# Altium footprint library Reflow3D1411sep.PcbLib: 657 footprints (part 12 of 42)
Each footprint in its own frame and in the unit in brackets; x right, y up, seen from the top. Pads: shape width x height; smd on the part's side, far side on the other; paste and mask are expansions set on the pad; w line width, h text height; cw(c..) or ccw(c..) is an arc to the next point about the centre after c.
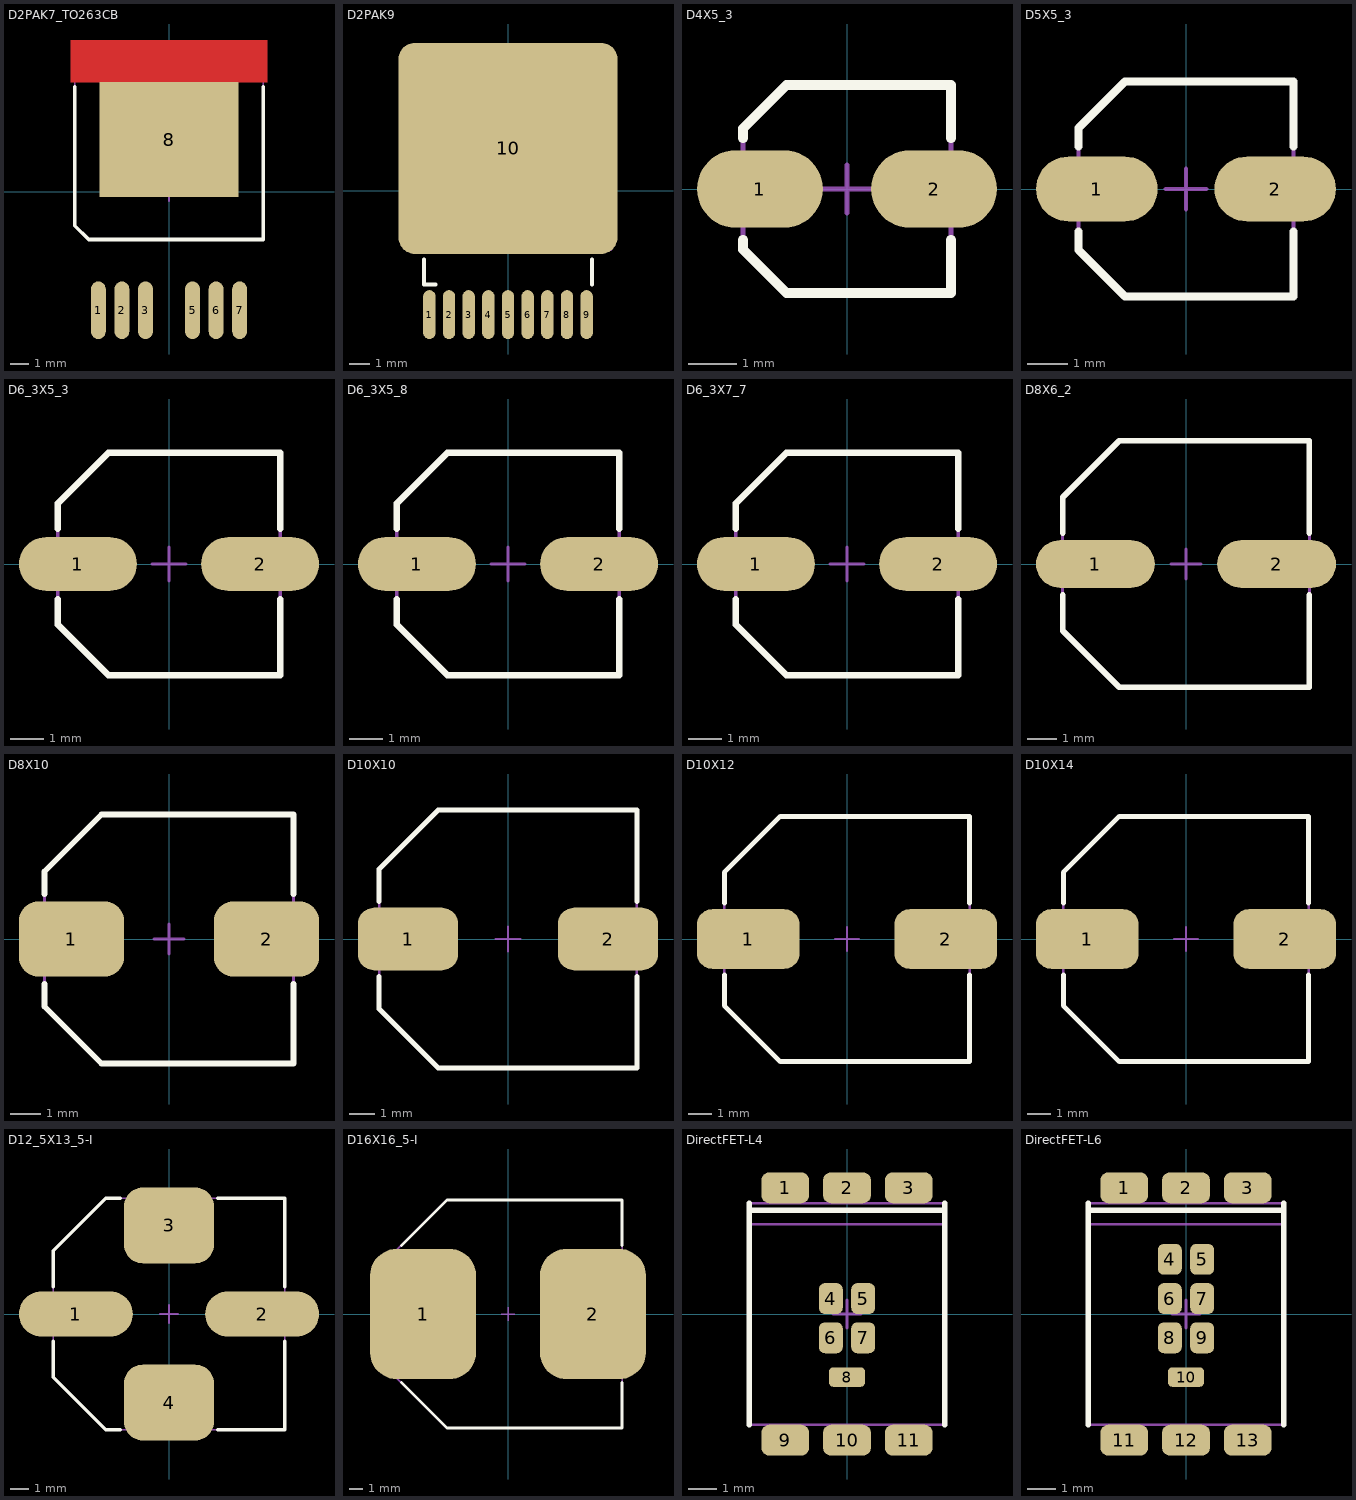
[diagram p11: the footprints below, top view; thin cyan lines are the x and y axes]

## D2PAK7_TO263CB [mm] "www.nxp.com, SOT427-REFLOW.pdf; www.irf.com, po_d2pak-7l.pdf; www.jedec.org, TO-263E.pdf"
height 4.45
pads (7):
  oval 0.8x3.1 smd paste-25.4 mask+0.075: 1(-3.81,-6.4) 2(-2.54,-6.4) 3(-1.27,-6.4) 5(1.27,-6.4) 6(2.54,-6.4) 7(3.81,-6.4)
  rect 7.5x6.2 smd paste-25.4 mask-25.4: 8(0,2.8)
Top Layer:
  region: -5.3,5.9 5.3,5.9 5.3,8.15 -5.3,8.15
Top Overlay:
  lines w0.2: -5.08,5.65 -5.08,-1.84 -4.33,-2.59 5.08,-2.59 5.08,5.65
Top Paste:
  region: -4.16,-6.5 -4.16,-7.9 -3.46,-7.9 -3.46,-6.5
  region: -4.16,-4.9 -4.16,-6.3 -3.46,-6.3 -3.46,-4.9
  region: -2,1.25 -3.7,1.25 -3.7,-0.25 -2,-0.25
  region: -3.75,5.95 -3.75,8.1 -5.25,8.1 -5.25,5.95
  region: -0.1,1.25 -1.8,1.25 -1.8,-0.25 -0.1,-0.25
  region: 3.7,1.25 2,1.25 2,-0.25 3.7,-0.25
  region: 1.8,1.25 0.1,1.25 0.1,-0.25 1.8,-0.25
  region: 1.8,4.35 0.1,4.35 0.1,2.85 1.8,2.85
  region: 3.7,4.35 2,4.35 2,2.85 3.7,2.85
  region: -0.1,4.35 -1.8,4.35 -1.8,2.85 -0.1,2.85
  region: -2,4.35 -3.7,4.35 -3.7,2.85 -2,2.85
  region: -1.95,5.95 -1.95,8.1 -3.45,8.1 -3.45,5.95
  region: -0.15,5.95 -0.15,8.1 -1.65,8.1 -1.65,5.95
  region: 5.25,5.95 5.25,8.1 3.75,8.1 3.75,5.95
  region: 3.45,5.95 3.45,8.1 1.95,8.1 1.95,5.95
  region: 1.65,5.95 1.65,8.1 0.15,8.1 0.15,5.95
  region: -2.89,-4.9 -2.89,-6.3 -2.19,-6.3 -2.19,-4.9
  region: -2.89,-6.5 -2.89,-7.9 -2.19,-7.9 -2.19,-6.5
  region: -1.62,-4.9 -1.62,-6.3 -0.92,-6.3 -0.92,-4.9
  region: -1.62,-6.5 -1.62,-7.9 -0.92,-7.9 -0.92,-6.5
  region: 0.92,-4.9 0.92,-6.3 1.62,-6.3 1.62,-4.9
  region: 0.92,-6.5 0.92,-7.9 1.62,-7.9 1.62,-6.5
  region: 2.19,-4.9 2.19,-6.3 2.89,-6.3 2.89,-4.9
  region: 2.19,-6.5 2.19,-7.9 2.89,-7.9 2.89,-6.5
  region: 3.46,-4.9 3.46,-6.3 4.16,-6.3 4.16,-4.9
  region: 3.46,-6.5 3.46,-7.9 4.16,-7.9 4.16,-6.5
Top Solder:
  region: 3.825,-0.375 3.825,5.825 5.375,5.825 5.375,8.225 -5.375,8.225 -5.375,5.825 -3.825,5.825 -3.825,-0.375
Mechanical 13:
  lines w0.1: -5.08,-1.84 -5.08,6.41 5.08,6.41 5.08,-2.59 -4.33,-2.59 -5.08,-1.84
Mechanical 15:
  lines w0.1: -0.5,0 0.5,0 ; 0,-0.5 0,0.5
3D body: height 4.83, standoff 0, extent -5.335,-2.915 5.335,6.735

## D2PAK9 [mm] "www.national.com, ts9a.pdf, AN-1797.pdf"
height 4.57
pads (10):
  oval 0.61x2.41 smd mask+0.075: 1(-3.88,-6.1) 2(-2.91,-6.1) 3(-1.94,-6.1) 4(-0.97,-6.1) 5(0,-6.1) 6(0.97,-6.1) 7(1.94,-6.1) 8(2.91,-6.1) 9(3.88,-6.1)
  rrect15% 10.8x10.41 smd paste-25.4 mask+0.075: 10(0,2.1)
Top Overlay:
  lines w0.2: -4.135,-3.375 -4.135,-4.625 -3.575,-4.625 ; 4.135,-4.625 4.135,-3.375
Top Paste:
  region: -1.95,0.215 -5.25,0.215 -5.25,-2.955 -1.95,-2.955
  region: 1.65,0.215 -1.65,0.215 -1.65,-2.955 1.65,-2.955
  region: 5.25,0.215 1.95,0.215 1.95,-2.955 5.25,-2.955
  region: 5.25,3.685 1.95,3.685 1.95,0.515 5.25,0.515
  region: 1.65,3.685 -1.65,3.685 -1.65,0.515 1.65,0.515
  region: -1.95,3.685 -5.25,3.685 -5.25,0.515 -1.95,0.515
  region: 5.25,7.155 1.95,7.155 1.95,3.985 5.25,3.985
  region: 1.65,7.155 -1.65,7.155 -1.65,3.985 1.65,3.985
  region: -1.95,7.155 -5.25,7.155 -5.25,3.985 -1.95,3.985
Mechanical 13:
  lines w0.1: -5.08,-2.16 -4.33,-2.91 5.08,-2.91 5.08,5.78 -5.08,5.78 -5.08,-2.16
Mechanical 15:
  lines w0.1: -0.5,0 0.5,0 ; 0,-0.5 0,0.5
3D body: height 4.62, standoff 0, extent -5.205,-2.935 5.205,5.805

## D4X5_3 [mm] "www.vishay.com, 153crv.pdf, ecb.pdf"
height 5.3
pads (2):
  oval 2.6x1.6 smd mask+0.075: 1(-1.8,0) 2(1.8,0)
Top Overlay:
  lines w0.2: -2.15,-1.05 -2.15,-1.25 -1.25,-2.15 2.15,-2.15 2.15,-1.05 ; -2.15,1.05 -2.15,1.25 -1.25,2.15 2.15,2.15 2.15,1.05
Mechanical 13:
  lines w0.1: -2.15,-1.25 -1.25,-2.15 2.15,-2.15 2.15,2.15 -1.25,2.15 -2.15,1.25 -2.15,-1.25
Mechanical 15:
  lines w0.1: -0.5,0 0.5,0 ; 0,-0.5 0,0.5
3D body: height 5.5, standoff 0, extent -2.25,-2.25 2.25,2.25

## D5X5_3 [mm] "www.vishay.com, 153crv.pdf, ecb.pdf"
height 5.3
pads (2):
  oval 3x1.6 smd mask+0.075: 1(-2.2,0) 2(2.2,0)
Top Overlay:
  lines w0.2: -2.65,-1.05 -2.65,-1.5 -1.5,-2.65 2.65,-2.65 2.65,-1.05 ; -2.65,1.05 -2.65,1.5 -1.5,2.65 2.65,2.65 2.65,1.05
Mechanical 13:
  lines w0.1: -1.5,2.65 -2.65,1.5 -2.65,-1.5 -1.5,-2.65 2.65,-2.65 2.65,2.65 -1.5,2.65 ; -1.5,2.65 -1.5,2.65
Mechanical 15:
  lines w0.1: -0.5,0 0.5,0 ; 0,-0.5 0,0.5
3D body: height 5.5, standoff 0, extent -2.75,-2.75 2.75,2.75

## D6_3X5_3 [mm] "www.vishay.com, 153crv.pdf, ecb.pdf"
height 5.3
pads (2):
  oval 3.5x1.6 smd mask+0.075: 1(-2.7,0) 2(2.7,0)
Top Overlay:
  lines w0.2: -3.3,-1.05 -3.3,-1.8 -1.8,-3.3 3.3,-3.3 3.3,-1.05 ; -3.3,1.05 -3.3,1.8 -1.8,3.3 3.3,3.3 3.3,1.05
Mechanical 13:
  lines w0.1: -3.3,-1.8 -1.8,-3.3 3.3,-3.3 3.3,3.3 -1.8,3.3 -3.3,1.8 -3.3,-1.8
Mechanical 15:
  lines w0.1: -0.5,0 0.5,0 ; 0,-0.5 0,0.5
3D body: height 5.6, standoff 0, extent -3.4,-3.4 3.4,3.4

## D6_3X5_8 [mm] "www.vishay.com, 153crv.pdf, ecb.pdf"
height 5.8
pads (2):
  oval 3.5x1.6 smd mask+0.075: 1(-2.7,0) 2(2.7,0)
Top Overlay:
  lines w0.2: -3.3,-1.05 -3.3,-1.8 -1.8,-3.3 3.3,-3.3 3.3,-1.05 ; -3.3,1.05 -3.3,1.8 -1.8,3.3 3.3,3.3 3.3,1.05
Mechanical 13:
  lines w0.1: -3.3,-1.8 -3.3,1.8 -1.8,3.3 3.3,3.3 3.3,-3.3 -1.8,-3.3 -3.3,-1.8
Mechanical 15:
  lines w0.1: -0.5,0 0.5,0 ; 0,-0.5 0,0.5
3D body: height 6.1, standoff 0, extent -3.4,-3.4 3.4,3.4

## D6_3X7_7 [mm] "www.vishay.com, 153crv.pdf, ecb.pdf"
height 7.7
pads (2):
  oval 3.5x1.6 smd mask+0.075: 1(-2.7,0) 2(2.7,0)
Top Overlay:
  lines w0.2: -3.3,-1.05 -3.3,-1.8 -1.8,-3.3 3.3,-3.3 3.3,-1.05 ; -3.3,1.05 -3.3,1.8 -1.8,3.3 3.3,3.3 3.3,1.05
Mechanical 13:
  lines w0.1: -3.3,-1.8 -1.8,-3.3 3.3,-3.3 3.3,3.3 -1.8,3.3 -3.3,1.8 -3.3,-1.8
Mechanical 15:
  lines w0.1: -0.5,0 0.5,0 ; 0,-0.5 0,0.5
3D body: height 8.1, standoff 0, extent -3.4,-3.4 3.4,3.4

## D8X6_2 [mm] "www.vishay.com, 153crv.pdf, ecb.pdf"
height 6.2
pads (2):
  oval 4x1.6 smd mask+0.075: 1(-3.05,0) 2(3.05,0)
Top Overlay:
  lines w0.2: -4.15,-1.05 -4.15,-2.25 -2.25,-4.15 4.15,-4.15 4.15,-1.05 ; -4.15,1.05 -4.15,2.25 -2.25,4.15 4.15,4.15 4.15,1.05
Mechanical 13:
  lines w0.1: -4.15,-2.25 -2.25,-4.15 4.15,-4.15 4.15,4.15 -2.25,4.15 -4.15,2.25 -4.15,-2.25
Mechanical 15:
  lines w0.1: -0.5,0 0.5,0 ; 0,-0.5 0,0.5
3D body: height 6.6, standoff 0, extent -4.25,-4.25 4.25,4.25

## D8X10 [mm] "www.vishay.com, 153crv.pdf, ecb.pdf"
height 10
pads (2):
  rrect50% 3.5x2.5 smd mask+0.075: 1(-3.25,0) 2(3.25,0)
Top Overlay:
  lines w0.2: -4.15,-1.5 -4.15,-2.25 -2.25,-4.15 4.15,-4.15 4.15,-1.5 ; -4.15,1.5 -4.15,2.25 -2.25,4.15 4.15,4.15 4.15,1.5
Mechanical 13:
  lines w0.1: -4.15,-2.25 -4.15,2.25 -2.25,4.15 4.15,4.15 4.15,-4.15 -2.25,-4.15 -4.15,-2.25
Mechanical 15:
  lines w0.1: -0.5,0 0.5,0 ; 0,-0.5 0,0.5
3D body: height 10.5, standoff 0, extent -4.25,-4.25 4.25,4.25

## D10X10 [mm] "www.vishay.com, 153crv.pdf, ecb.pdf"
height 10
pads (2):
  rrect50% 4x2.5 smd mask+0.075: 1(-4,0) 2(4,0)
Top Overlay:
  lines w0.2: -5.15,-1.5 -5.15,-2.8 -2.8,-5.15 5.15,-5.15 5.15,-1.5 ; -5.15,1.5 -5.15,2.8 -2.8,5.15 5.15,5.15 5.15,1.5
Mechanical 13:
  lines w0.1: -5.15,-2.8 -5.15,2.8 -2.8,5.15 5.15,5.15 5.15,-5.15 -2.8,-5.15 -5.15,-2.8
Mechanical 15:
  lines w0.1: -0.5,0 0.5,0 ; 0,-0.5 0,0.5
3D body: height 10.5, standoff 0, extent -5.25,-5.25 5.25,5.25

## D10X12 [mm] "www.vishay.com, 153crv.pdf, ecb.pdf"
height 12
pads (2):
  rrect50% 4.3x2.5 smd mask+0.075: 1(-4.15,0) 2(4.15,0)
Top Overlay:
  lines w0.2: -5.15,-1.5 -5.15,-2.8 -2.8,-5.15 5.15,-5.15 5.15,-1.5 ; -5.15,1.5 -5.15,2.8 -2.8,5.15 5.15,5.15 5.15,1.5
Mechanical 13:
  lines w0.1: -5.15,-2.8 -2.8,-5.15 5.15,-5.15 5.15,5.15 -2.8,5.15 -5.15,2.8 -5.15,-2.8
Mechanical 15:
  lines w0.1: -0.5,0 0.5,0 ; 0,-0.5 0,0.5
3D body: height 12.3, standoff 0, extent -5.3,-5.3 5.3,5.3

## D10X14 [mm] "www.vishay.com, 153crv.pdf, ecb.pdf"
height 14
pads (2):
  rrect50% 4.3x2.5 smd mask+0.075: 1(-4.15,0) 2(4.15,0)
Top Overlay:
  lines w0.2: -5.15,-1.5 -5.15,-2.8 -2.8,-5.15 5.15,-5.15 5.15,-1.5 ; -5.15,1.5 -5.15,2.8 -2.8,5.15 5.15,5.15 5.15,1.5
Mechanical 13:
  lines w0.1: -5.15,-2.8 -2.8,-5.15 5.15,-5.15 5.15,5.15 -2.8,5.15 -5.15,2.8 -5.15,-2.8
Mechanical 15:
  lines w0.1: -0.5,0 0.5,0 ; 0,-0.5 0,0.5
3D body: height 14.3, standoff 0, extent -5.3,-5.3 5.3,5.3

## D12_5X13_5-I [mm] "www.vishay.com, 140crh.pdf, eca.pdf"
height 13.5
pads (4):
  oval 6.3x2.5 smd mask+0.075: 1(-5.15,0) 2(5.15,0)
  rrect50% 5x4.2 smd mask+0.075: 3(0,4.9) 4(0,-4.9)
Top Overlay:
  lines w0.2: -6.4,-1.5 -6.4,-3.5 -3.5,-6.4 -2.7,-6.4 ; -6.4,1.5 -6.4,3.5 -3.5,6.4 -2.7,6.4 ; 2.7,-6.4 6.4,-6.4 6.4,-1.5 ; 2.7,6.4 6.4,6.4 6.4,1.5
Mechanical 13:
  lines w0.1: -6.4,-3.5 -3.5,-6.4 6.4,-6.4 6.4,6.4 -3.5,6.4 -6.4,3.5 -6.4,-3.5
Mechanical 15:
  lines w0.1: -0.5,0 0.5,0 ; 0,-0.5 0,0.5
3D body: height 14, standoff 0, extent -6.5,-6.5 6.5,6.5

## D16X16_5-I [mm] "www.vishay.com, 140crh.pdf, eca.pdf"
height 16.5
pads (2):
  rrect50% 7.8x9.6 smd mask+0.075: 1(-6.25,0) 2(6.25,0)
Top Overlay:
  lines w0.2: -7.85,-5.05 -4.5,-8.4 8.4,-8.4 8.4,-5.05 ; -7.85,5.05 -4.5,8.4 8.4,8.4 8.4,5.05
Mechanical 13:
  lines w0.1: -8.4,-4.5 -8.4,4.5 -4.5,8.4 8.4,8.4 8.4,-8.4 -4.5,-8.4 -8.4,-4.5
Mechanical 15:
  lines w0.1: -0.5,0 0.5,0 ; 0,-0.5 0,0.5
3D body: height 17, standoff 0, extent -8.5,-8.5 8.5,8.5

## DirectFET-L4 [mm] "www.irf.com, L4-Outline.pdf, an-1035.pdf"
height 0.71
pads (11):
  rrect50% 1.7x1.1 smd paste-25.4 mask+0: 1(-2.2,4.5) 2(0,4.5) 3(2.2,4.5) 9(-2.2,-4.5) 10(0,-4.5) 11(2.2,-4.5)
  rrect50% 0.85x1.1 smd paste-25.4 mask+0: 4(-0.575,0.55) 5(0.575,0.55) 6(-0.575,-0.85) 7(0.575,-0.85)
  rrect50% 1.3x0.7 smd paste-25.4 mask+0: 8(0,-2.25)
Top Overlay:
  lines w0.2: -3.49,-3.95 -3.49,3.95 ; -3.49,3.7 3.49,3.7 ; 3.49,-3.95 3.49,3.95
Top Paste:
  region: 0.225,1.05 0.225,0.05 0.925,0.05 0.925,1.05
  region: -0.925,1.05 -0.925,0.05 -0.225,0.05 -0.225,1.05
  region: -0.925,-0.35 -0.925,-1.35 -0.225,-1.35 -0.225,-0.35
  region: -2.95,4.95 -2.95,4.05 -1.45,4.05 -1.45,4.95
  region: -0.75,4.95 -0.75,4.05 0.75,4.05 0.75,4.95
  region: 1.45,4.95 1.45,4.05 2.95,4.05 2.95,4.95
  region: 1.45,-4.05 1.45,-4.95 2.95,-4.95 2.95,-4.05
  region: -0.75,-4.05 -0.75,-4.95 0.75,-4.95 0.75,-4.05
  region: 0.225,-0.35 0.225,-1.35 0.925,-1.35 0.925,-0.35
  region: -2.95,-4.05 -2.95,-4.95 -1.45,-4.95 -1.45,-4.05
  region: -0.55,-1.935 -0.55,-2.565 0.55,-2.565 0.55,-1.935
Mechanical 13:
  lines w0.1: -3.49,3.2 3.49,3.2 ; -3.49,-3.95 -3.49,3.95 3.49,3.95 3.49,-3.95 -3.49,-3.95
Mechanical 15:
  lines w0.1: -0.5,0 0.5,0 ; 0,-0.5 0,0.5
3D body: height 0.74, standoff 0, extent -3.55,-4.025 3.55,4.025

## DirectFET-L6 [mm] "www.irf.com, L6-Outline.pdf, an-1035.pdf"
height 0.71
pads (13):
  rrect50% 1.7x1.1 smd paste-25.4 mask+0: 1(-2.2,4.5) 2(0,4.5) 3(2.2,4.5) 11(-2.2,-4.5) 12(0,-4.5) 13(2.2,-4.5)
  rrect50% 0.85x1.1 smd paste-25.4 mask+0: 4(-0.575,1.95) 5(0.575,1.95) 6(-0.575,0.55) 7(0.575,0.55) 8(-0.575,-0.85) 9(0.575,-0.85)
  rrect50% 1.3x0.7 smd paste-25.4 mask+0: 10(0,-2.25)
Top Overlay:
  lines w0.2: -3.49,-3.95 -3.49,3.95 ; -3.49,3.7 3.49,3.7 ; 3.49,-3.95 3.49,3.95
Top Paste:
  region: 0.225,1.05 0.225,0.05 0.925,0.05 0.925,1.05
  region: -0.925,1.05 -0.925,0.05 -0.225,0.05 -0.225,1.05
  region: -0.925,-0.35 -0.925,-1.35 -0.225,-1.35 -0.225,-0.35
  region: -2.95,4.95 -2.95,4.05 -1.45,4.05 -1.45,4.95
  region: -0.75,4.95 -0.75,4.05 0.75,4.05 0.75,4.95
  region: 1.45,4.95 1.45,4.05 2.95,4.05 2.95,4.95
  region: 1.45,-4.05 1.45,-4.95 2.95,-4.95 2.95,-4.05
  region: -0.75,-4.05 -0.75,-4.95 0.75,-4.95 0.75,-4.05
  region: 0.225,-0.35 0.225,-1.35 0.925,-1.35 0.925,-0.35
  region: -2.95,-4.05 -2.95,-4.95 -1.45,-4.95 -1.45,-4.05
  region: -0.55,-1.935 -0.55,-2.565 0.55,-2.565 0.55,-1.935
  region: -0.925,2.45 -0.925,1.45 -0.225,1.45 -0.225,2.45
  region: 0.225,2.45 0.225,1.45 0.925,1.45 0.925,2.45
Mechanical 13:
  lines w0.1: -3.49,3.2 3.49,3.2 ; -3.49,-3.95 3.49,-3.95 3.49,3.95 -3.49,3.95 -3.49,-3.95
Mechanical 15:
  lines w0.1: -0.5,0 0.5,0 ; 0,-0.5 0,0.5
3D body: height 0.74, standoff 0, extent -3.55,-4.025 3.55,4.025